# Altium footprint library ZabugorLib.PcbLib: 89 footprints (part 3 of 6)
Each footprint in its own frame and in the unit in brackets; x right, y up, seen from the top. Pads: shape width x height; smd on the part's side, far side on the other; paste and mask are expansions set on the pad; w line width, h text height; cw(c..) or ccw(c..) is an arc to the next point about the centre after c.
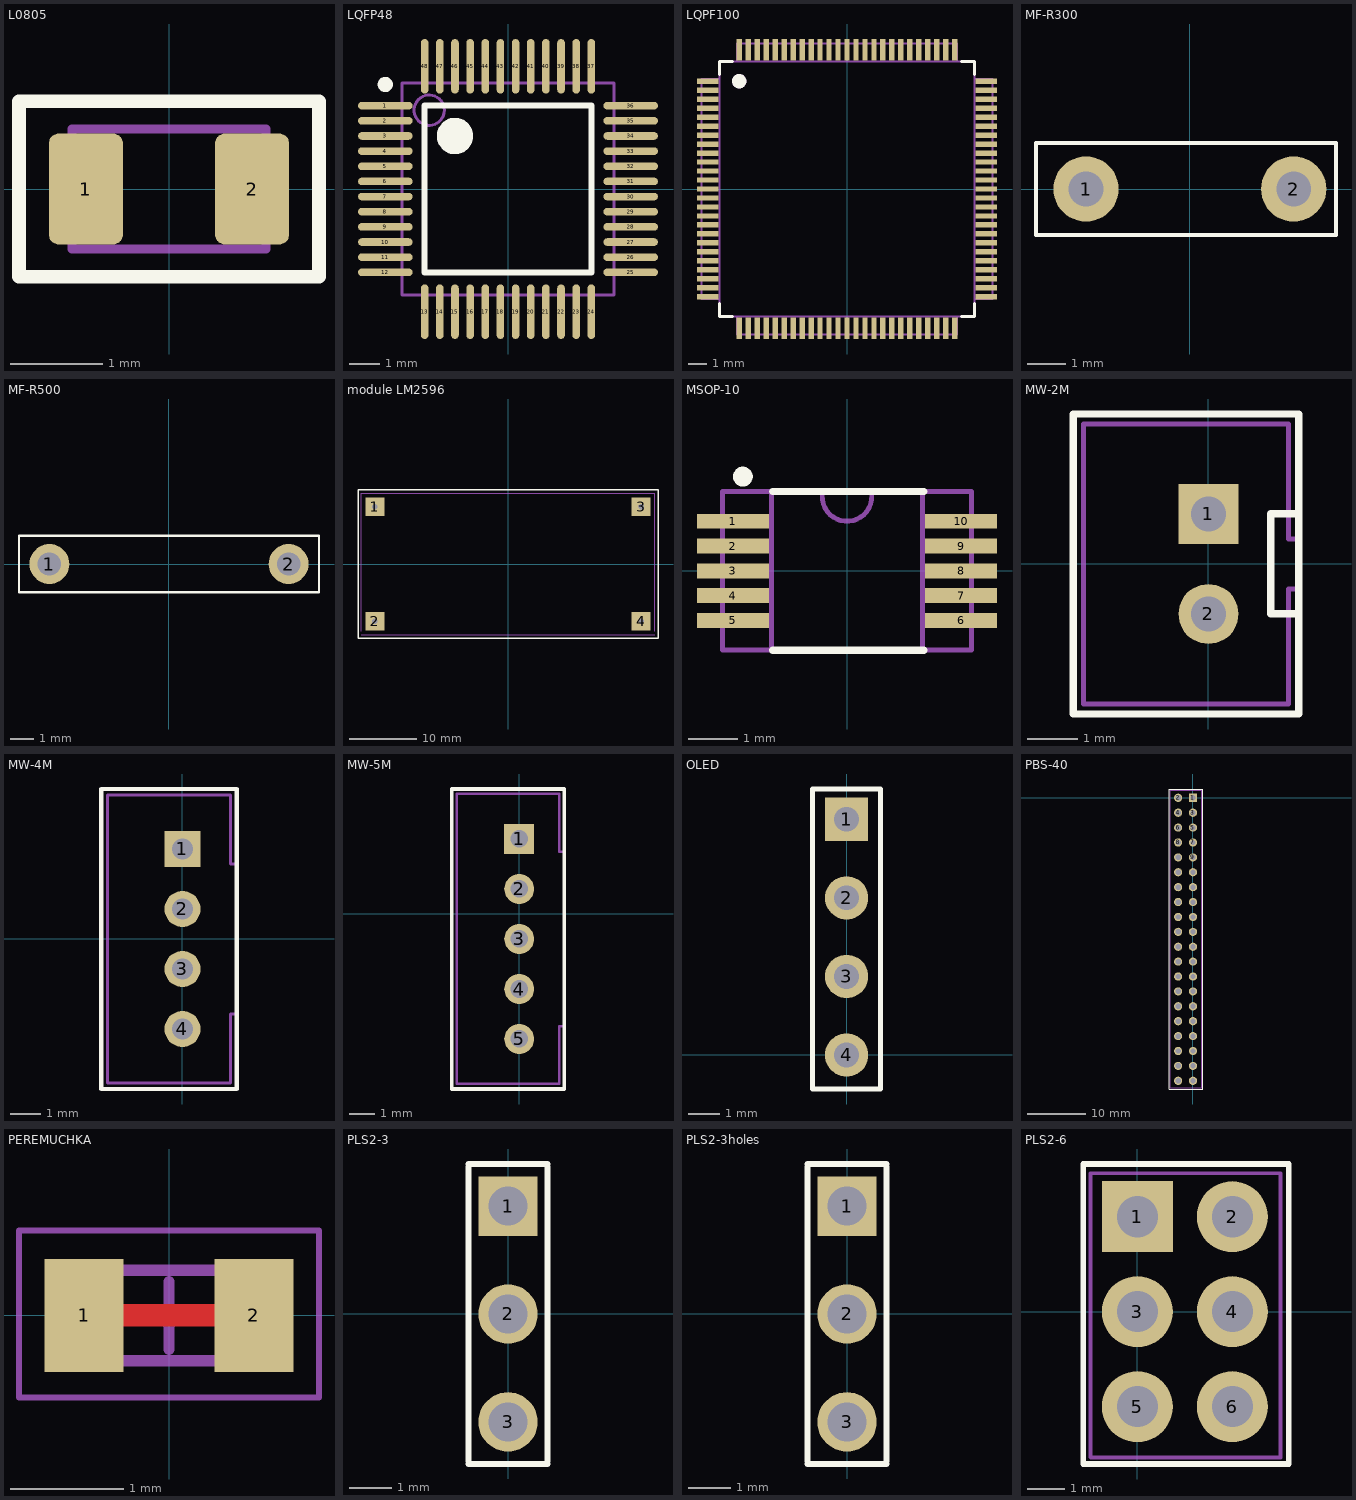
[diagram p2: the footprints below, top view; thin cyan lines are the x and y axes]

## L0805 [mm]
height 1.4
pads (2):
  rrect25% 0.8x1.2 smd: 1(-0.9,0) 2(0.9,0)
Top Overlay:
  lines w0.15: -1.625,-0.95 1.625,-0.95 1.625,0.95 -1.625,0.95 -1.625,-0.95
Mechanical 7:
  lines w0.1: -1.05,-0.65 1.05,-0.65 1.05,0.65 -1.05,0.65 -1.05,-0.65
Mechanical 10:
  text ".Comment" at -1.125,-1.625 h0.6
  text ".Designator" at -1.525,1.375 h0.8
3D body "User Library-CR2012-0805.step": height 0.6, standoff 0, extent -1,-0.625 1,0.625

## LQFP48 [mm] "Thin QFP, 48-Leads, Body 7x7mm, Pitch 0.5mm, IPC Medium Density"
height 1.6
pads (48):
  oval 1.8x0.25 smd: 1(-4.05,2.75) 2(-4.05,2.25) 3(-4.05,1.75) 4(-4.05,1.25) 5(-4.05,0.75) 6(-4.05,0.25) 7(-4.05,-0.25) 8(-4.05,-0.75) 9(-4.05,-1.25) 10(-4.05,-1.75) 11(-4.05,-2.25) 12(-4.05,-2.75) 25(4.05,-2.75) 26(4.05,-2.25) 27(4.05,-1.75) 28(4.05,-1.25) 29(4.05,-0.75) 30(4.05,-0.25) 31(4.05,0.25) 32(4.05,0.75) 33(4.05,1.25) 34(4.05,1.75) 35(4.05,2.25) 36(4.05,2.75)
  oval 0.25x1.8 smd: 13(-2.75,-4.05) 14(-2.25,-4.05) 15(-1.75,-4.05) 16(-1.25,-4.05) 17(-0.75,-4.05) 18(-0.25,-4.05) 19(0.25,-4.05) 20(0.75,-4.05) 21(1.25,-4.05) 22(1.75,-4.05) 23(2.25,-4.05) 24(2.75,-4.05) 37(2.75,4.05) 38(2.25,4.05) 39(1.75,4.05) 40(1.25,4.05) 41(0.75,4.05) 42(0.25,4.05) 43(-0.25,4.05) 44(-0.75,4.05) 45(-1.25,4.05) 46(-1.75,4.05) 47(-2.25,4.05) 48(-2.75,4.05)
Top Overlay:
  circle w0.25: c-4.05,3.45 r0.125
  circle w0.6: c-1.75,1.75 r0.3
  lines w0.2: -2.75,-2.75 -2.75,2.75 2.75,2.75 2.75,-2.75 -2.75,-2.75
Mechanical 7:
  circle w0.1: c-2.6,2.6 r0.5
  lines w0.1: -3.5,-3.5 -3.5,3.5 3.5,3.5 3.5,-3.5 -3.5,-3.5
Mechanical 10:
  text ".Comment" at -3.7,-5.6 h0.6
  text ".Designator" at 1.9,5.4 h0.8
3D body "vbh48a.stp": height 1.46, standoff -0.04, extent -4.507,-4.507 4.508,4.508

## LQPF100 [mm] "Микроконтроллер STM32F407VGT6"
height 1.6
pads (100):
  rect 1.2x0.3 smd: 1(-7.75,6) 2(-7.75,5.5) 3(-7.75,5) 4(-7.75,4.5) 5(-7.75,4) 6(-7.75,3.5) 7(-7.75,3) 8(-7.75,2.5) 9(-7.75,2) 10(-7.75,1.5) 11(-7.75,1) 12(-7.75,0.5) 13(-7.75,0) 14(-7.75,-0.5) 15(-7.75,-1) 16(-7.75,-1.5) 17(-7.75,-2) 18(-7.75,-2.5) 19(-7.75,-3) 20(-7.75,-3.5) 21(-7.75,-4) 22(-7.75,-4.5) 23(-7.75,-5) 24(-7.75,-5.5) 25(-7.75,-6) 51(7.75,-6) 52(7.75,-5.5) 53(7.75,-5) 54(7.75,-4.5) 55(7.75,-4) 56(7.75,-3.5) 57(7.75,-3) 58(7.75,-2.5) 59(7.75,-2) 60(7.75,-1.5) 61(7.75,-1) 62(7.75,-0.5) 63(7.75,0) 64(7.75,0.5) 65(7.75,1) 66(7.75,1.5) 67(7.75,2) 68(7.75,2.5) 69(7.75,3) 70(7.75,3.5) 71(7.75,4) 72(7.75,4.5) 73(7.75,5) 74(7.75,5.5) 75(7.75,6)
  rect 0.3x1.2 smd: 26(-6,-7.75) 27(-5.5,-7.75) 28(-5,-7.75) 29(-4.5,-7.75) 30(-4,-7.75) 31(-3.5,-7.75) 32(-3,-7.75) 33(-2.5,-7.75) 34(-2,-7.75) 35(-1.5,-7.75) 36(-1,-7.75) 37(-0.5,-7.75) 38(0,-7.75) 39(0.5,-7.75) 40(1,-7.75) 41(1.5,-7.75) 42(2,-7.75) 43(2.5,-7.75) 44(3,-7.75) 45(3.5,-7.75) 46(4,-7.75) 47(4.5,-7.75) 48(5,-7.75) 49(5.5,-7.75) 50(6,-7.75) 76(6,7.75) 77(5.5,7.75) 78(5,7.75) 79(4.5,7.75) 80(4,7.75) 81(3.5,7.75) 82(3,7.75) 83(2.5,7.75) 84(2,7.75) 85(1.5,7.75) 86(1,7.75) 87(0.5,7.75) 88(0,7.75) 89(-0.5,7.75) 90(-1,7.75) 91(-1.5,7.75) 92(-2,7.75) 93(-2.5,7.75) 94(-3,7.75) 95(-3.5,7.75) 96(-4,7.75) 97(-4.5,7.75) 98(-5,7.75) 99(-5.5,7.75) 100(-6,7.75)
Top Overlay:
  circle w0.4: c-6,6 r0.2
  lines w0.15: -7.1,-6.375 -7.1,-7.1 -6.375,-7.1 ; -7.1,6.375 -7.1,7.1 -6.375,7.1 ; 6.375,-7.1 7.1,-7.1 7.1,-6.375 ; 6.375,7.1 7.1,7.1 7.1,6.375
Mechanical 7:
  circle w0.4: c-6,6 r0.2
  lines w0.1: -7.1,-6.135 -8.1,-6.135 -8.1,6.135 -7.1,6.135 ; -6.135,-7.1 -6.135,-8.1 6.135,-8.1 6.135,-7.1 ; -6.135,7.1 -6.135,8.1 6.135,8.1 6.135,7.1 ; 7.1,-6.135 8.1,-6.135 8.1,6.135 7.1,6.135 ; -7.1,-7.1 -7.1,7.1 7.1,7.1 7.1,-7.1 -7.1,-7.1
Mechanical 10:
  text ".Comment" at -1.08,-0.495 h0.6
  text ".Designator" at -1.2,0.155 h0.8
3D body "User Library-LQFP100-3.STEP": height 1.62, standoff -0.01, extent -8.072,-8.072 8.072,8.072

## MF-R300 [mm] "Самовосстанавливающийся предохранитель"
pads (2):
  round 1.7 hole 0.9: 1(-2.7,0) 2(2.7,0)
Top Overlay:
  lines w0.1: -4,-1.2 -4,-1 -4,1.2 3.8,1.2 3.8,-1.2 -4,-1.2
3D body "User Library-MF-R250.STEP": height 19.3, standoff -6.6, extent -6.12,-3.377 6.12,3.377

## MF-R500 [mm] "Самовосстанавливающийся предохранитель"
pads (2):
  round 1.7 hole 1: 1(-5.1,0) 2(5.1,0)
Top Overlay:
  lines w0.1: -6.4,-1.2 6.4,-1.2 6.4,1.2 -6.4,1.2 -6.4,-1 -6.4,-1.2
3D body "User Library-MF-R700.step": height 32.8, standoff -1, extent -10.801,-3.354 10.801,3.2

## module LM2596 [mm]
pads (4):
  rect 2.8x2.8 hole 0.8: 1(-19.75,8.5) 2(-19.75,-8.5) 3(19.75,8.5) 4(19.75,-8.5)
Top Overlay:
  lines w0.2: -22.25,-11 -22.25,11 22.25,11 22.25,-11 -22.25,-11
Mechanical 7:
  lines w0.05: -21.75,-10.5 0.75,-10.5 21.75,-10.5 ; -21.75,-10 -21.75,10.5 21.75,10.5 21.75,-10
3D body "User Library-DC-DC MODULE LM2596s.STEP": height 13.71, standoff -0.1, extent -21.75,-10.5 21.75,10.5

## MSOP-10 [mm]
height 0.9
pads (10):
  rect 1.45x0.3 smd: 1(-2.3,1) 2(-2.3,0.5) 3(-2.3,0) 4(-2.3,-0.5) 5(-2.3,-1) 6(2.3,-1) 7(2.3,-0.5) 8(2.3,0) 9(2.3,0.5) 10(2.3,1)
Top Overlay:
  circle w0.2: c-2.1,1.9 r0.1
  lines w0.15: -1.5,-1.6 1.55,-1.6 ; -1.5,1.6 1.55,1.6
Mechanical 7:
  lines w0.1: -1.525,-1.6 -1.525,1.6 ; -0.499,1.525 ccw(c0,1.5) 0.499,1.525 ; 1.525,-1.6 1.525,1.6 ; -2.515,-1.6 2.515,-1.6 2.515,1.6 -2.515,1.6 -2.515,-1.6
Mechanical 10:
  text ".Designator" at -0.67,2.04 h0.8
  text ".Comment" at -0.67,-2.26 h0.6
3D body "User Library-MSOP10-1.step": height 1.09, standoff 0, extent -2.575,-1.6 2.575,1.6

## MW-2M [mm]
height 6
pads (2):
  rect 1.2x1.2 hole 0.7: 1(0,1)
  round 1.2 hole 0.7: 2(0,-1)
Top Overlay:
  lines w0.15: 1.8,-1 1.25,-1 1.25,1 1.8,1 ; -2.7,-3 1.8,-3 1.8,3 -2.7,3 -2.7,-3
Mechanical 9:
  text ".Designator" at -1.28,3.98 h0.8
  text ".Comment" at -1.27,3.41 h0.6
Mechanical 11:
  lines w0.1: 1.79,0.5 1.6,0.5 1.6,2.8 -2.5,2.8 -2.5,-2.8 1.6,-2.8 1.6,-0.5 1.8,-0.5 ; -2.7,-3 -2.7,3 1.8,3 1.8,-3 -2.7,-3
3D body "B2B-PH-K-S.STEP": height 6, standoff -3.4, extent -2.7,-2.95 1.8,2.95

## MW-4M [mm]
height 6
pads (4):
  rect 1.2x1.2 hole 0.7: 1(0,3)
  round 1.2 hole 0.7: 2(0,1) 3(0,-1) 4(0,-3)
Top Overlay:
  lines w0.15: -2.7,-5 1.8,-5 1.8,5 -2.7,5 -2.7,-5
Mechanical 7:
  lines w0.1: 1.79,-2.5 1.6,-2.5 1.6,-4.8 -2.5,-4.8 -2.5,4.8 1.6,4.8 1.6,2.5 1.79,2.5 ; -2.7,-5 1.8,-5 1.8,5 -2.7,5 -2.7,-5
Mechanical 10:
  text ".Comment" at -1.27,5.41 h0.6
  text ".Designator" at -1.28,5.98 h0.8
3D body "B4B-PH-K-S.STEP": height 6, standoff -3.4, extent -2.7,-4.95 1.8,4.95

## MW-5M [mm]
pads (5):
  rect 1.2x1.2 hole 0.7: 1(0,3)
  round 1.2 hole 0.7: 2(0,1) 3(0,-1) 4(0,-3) 5(0,-5)
Top Overlay:
  lines w0.15: -2.7,-7 1.8,-7 1.8,5 -2.7,5 -2.7,-7
Mechanical 7:
  lines w0.1: 1.79,-4.5 1.6,-4.5 1.6,-6.8 -2.5,-6.8 -2.5,4.8 1.6,4.8 1.6,2.5 1.79,2.5 ; -2.7,-7 1.8,-7 1.8,5 -2.7,5 -2.7,-7
Mechanical 10:
  text ".Comment" at -1.27,5.41 h0.6
  text ".Designator" at -1.28,5.98 h0.8
3D body "B5B-PH-K-S.STEP": height 6, standoff -3.4, extent -2.7,-6.95 1.8,4.95

## OLED [mm]
height 0.05
pads (4):
  rect 1.4x1.4 hole 0.8 unplated: 1(0,7.62)
  round 1.4 hole 0.8 unplated: 2(0,5.08) 3(0,2.54)
  round 1.4 hole 0.8 unplated mask+0.102: 4(0,0)
Top Overlay:
  lines w0.15: -1.1,-1.1 -1.1,8.6 1.1,8.6 1.1,-1.1 -1.1,-1.1
Mechanical 7:
  lines w0.1: 0.93,8.58 -1.1,8.58 -1.1,-1.1 1.1,-1.1 ; 1.1,-0.92 1.13,8.38
Mechanical 10:
  text ".Designator" at 1.2,8.4 h0.8
  text ".Comment" at 1.1,-0.3 h0.6
3D body "User Library-128x64I2COLEDDisplayAdafruit.step": height 1.47, standoff -9.37, extent -2.93,-9.5 24.93,17.2

## PBS-40 [mm]
height 0.05
pads (40):
  rect 1.4x1.4 hole 0.92: 1(0,0)
  round 1.4 hole 0.92: 2(-2.54,0) 3(0,-2.54) 4(-2.54,-2.54) 5(0,-5.08) 6(-2.54,-5.08) 8(-2.54,-7.62) 9(0,-10.16) 10(-2.54,-10.16) 11(0,-12.7) 12(-2.54,-12.7) 13(0,-15.24) 14(-2.54,-15.24) 15(0,-17.78) 16(-2.54,-17.78) 19(0,-22.86) 20(-2.54,-22.86) 21(0,-25.4) 22(-2.54,-25.4) 23(0,-27.94) 24(-2.54,-27.94) 25(0,-30.48) 26(-2.54,-30.48) 27(0,-33.02) 28(-2.54,-33.02) 31(0,-38.1) 32(-2.54,-38.1) 33(0,-40.64) 34(-2.54,-40.64) 35(0,-43.18) 36(-2.54,-43.18) 39(0,-48.26) 40(-2.54,-48.26)
  round 1.4 hole 0.92 mask+0.102: 7(0,-7.62) 17(0,-20.32) 18(-2.54,-20.32) 29(0,-35.56) 30(-2.54,-35.56) 37(0,-45.72) 38(-2.54,-45.72)
Top Overlay:
  lines w0.15: -4.04,-49.66 -4.04,1.5 1.66,1.5 1.66,-49.66 -4.04,-49.66
Mechanical 7:
  lines w0.1: -3.85,-49.41 1.46,-49.41 1.46,1.25 -3.85,1.25 -3.85,-49.4
Mechanical 10:
  text ".Designator" at -1.34,0.78 h0.8
  text ".Comment" at -1.44,-7.92 h0.6
3D body "User Library-PBS-10.step": height 8.4, standoff -3.2, extent -3.81,-24.13 -1.27,1.27
3D body "User Library-PBS-10.step": height 8.4, standoff -3.2, extent -1.27,-24.13 1.27,1.27
3D body "User Library-PBS-10.step": height 8.4, standoff -3.2, extent -3.81,-49.53 -1.27,-24.13
3D body "User Library-PBS-10.step": height 8.4, standoff -3.2, extent -1.27,-49.53 1.27,-24.13

## PEREMUCHKA [mm]
height 0.45
pads (2):
  rect 0.7x1 smd paste-5: 1(-0.75,0) 2(0.75,0)
Top Layer:
  lines w0.2: -0.5,0 0.5,0
Mechanical 11:
  lines w0.1: -0.9,-0.4 0.8,-0.4 0.8,0.4 -0.9,0.4 -0.9,-0.4
Mechanical 15:
  lines w0.05: -1.325,-0.725 -1.325,0.75 1.325,0.75 1.325,-0.725 -1.325,-0.725
  lines w0.1: -0.3,0 0.3,0 ; 0,-0.3 0,0.3

## PLS2-3 [mm]
height 0.05
pads (3):
  rect 1.4x1.4 hole 0.92: 1(0,2.54)
  round 1.4 hole 0.92: 2(0,0) 3(0,-2.54)
Top Overlay:
  lines w0.15: -0.93,-3.53 0.93,-3.53 ; -0.93,-3.47 -0.93,3.47 ; -0.93,3.53 0.93,3.53 ; 0.93,-3.47 0.93,3.47
Mechanical 7:
  lines w0.1: -0.93,-3.53 0.93,-3.53 ; -0.93,-3.47 -0.93,3.47 ; -0.93,3.53 0.93,3.53 ; 0.93,-3.47 0.93,3.47
Mechanical 10:
  text ".Comment" at -0.7,-4.1 h0.6
  text ".Designator" at -0.3,3.7 h0.8
3D body "User Library-PLS-3.step": height 8.54, standoff -3, extent -1.24,-3.81 1.3,3.81

## PLS2-3holes [mm]
height 0.05
pads (3):
  rect 1.4x1.4 hole 0.92: 1(0,2.54)
  round 1.4 hole 0.92: 2(0,0) 3(0,-2.54)
Top Overlay:
  lines w0.15: -0.93,-3.53 0.93,-3.53 ; -0.93,-3.47 -0.93,3.47 ; -0.93,3.53 0.93,3.53 ; 0.93,-3.47 0.93,3.47
Mechanical 7:
  lines w0.1: -0.93,-3.53 0.93,-3.53 ; -0.93,-3.47 -0.93,3.47 ; -0.93,3.53 0.93,3.53 ; 0.93,-3.47 0.93,3.47
Mechanical 10:
  text ".Designator" at -0.3,3.7 h0.8
  text ".Comment" at -0.7,-4.1 h0.6

## PLS2-6 [mm] "Разъем для программатора ISP"
height 0.05
pads (6):
  rect 1.9x1.9 hole 1.1: 1(0,2.54)
  round 1.9 hole 1.1: 2(2.54,2.54) 3(0,0) 4(2.54,0) 5(0,-2.54) 6(2.54,-2.54)
Top Overlay:
  lines w0.15: -1.45,-4.075 -1.45,3.95 4.05,3.95 4.05,-4.075 -1.45,-4.075
Mechanical 7:
  lines w0.1: 3.8,3.7 -1.255,3.7 -1.255,-3.895 -1.25,-3.9 3.825,-3.9 3.825,3.7
Mechanical 10:
  text ".Comment" at -0.7,-4.1 h0.6
  text ".Designator" at -0.3,3.7 h0.8
3D body "User Library-PLS-3.step": height 8.54, standoff -3, extent -1.265,-3.91 1.275,3.71
3D body "User Library-PLS-3.step": height 8.54, standoff -3, extent 1.275,-3.91 3.815,3.71